# Altium integrated library Integrated_Library - 02.02.25 - 22.49.IntLib: 792 symbols (part 2 of 11) (continued)
## CMP-002-00038-2
designator J?, comment 10103594-0001LF
Micro USB 2.0 B Receptacle, 5 Position, Height 3.24 mm, -55 to 85 degC, RoHS, Tape and Reel; Manufacturer: FCI Electronics; Gender: Female; Current Rating: 1.8A; Voltage Rating: 100V; Min Operating Temperature: -55°C; Package Reference: FCI-10103594-0001LF; Max Operating Temperature: 85°C; Lead Pitch: 0.65mm; Case/Package: FCI-10103594-0001LF; Package Quantity: 1500; Connector Type: USB; Mounting Technology: SM; Datasheet Version: Rev. A, 06/2010; Contact Material: Copper; Package Description: 5-Pin Surface Mount Device, Body 8.04 x 5.62 mm; Contact Plating: Gold; Packaging: TapeandReel; Datasheet URL: http://portal.fciconnect.com/Comergent//fci/drawing/10103594.pdf; Pins: 5; RoHS Compliant: True; Manufacturer URL: http://portal.fciconnect.com/
footprint FCI-10103594-0001LF_V (SMD, 5-Leads, Body 8.04x5.62mm, Pitch 0.65 mm)
pins: 1 VBUS, 2 D-, 3 D+, 4 ID, 5 GND, 6 SHLD1, 7 SHLD2, 8 SHLD3, 9 SHLD4, 10 SHLD5, 11 SHLD6

## CMP-002-00039-2
designator J?, comment 1734366-1
Recept Assy Type A USB, 4 Position, Height 15 mm, -55 to 85 degC, RoHS, Tray; Manufacturer: TE Connectivity; Voltage Rating: 30V; Gender: Female; Current Rating: 1A; Manufacturer URL: http://www.te.com/; Packaging: Tray; Package Quantity: 24000; Pins: 4; Package Description: 6-Pin Through Hole Device, Length 15 mm, Height 15 mm, Tail Length 2.8 mm; Colour: Black; Max Operating Temperature: 50°C; Datasheet Version: Rev. C3, 03/2016; Contact Plating: Gold; Case/Package: 1734366-1; RoHS Compliant: True; Min Operating Temperature: 0°C; Voltage Rating (AC): 30V; Connector Type: USB; Package Reference: 1734366-1; Contact Material: Copper; Max Voltage Rating (AC): 30V; Datasheet URL: http://www.te.com/commerce/DocumentDelivery/DDEController?Action=showdoc&DocId=Customer+Drawing%7F1734366%7FC3%7Fpdf%7FEnglish%7FENG_CD_1734366_C3.pdf%7F1734366-1; Mounting Technology: TH
footprint TE-1734366-1_V (Connector, 6-Leads, Body 7.62x15mm)
pins: 1 VBUS, 2 D-, 3 D+, 4 GND, 5 SHLD1, 6 SHLD2

## CMP-002-00040-2
designator J?, comment 480-37-1000
Universal Serial Bus (USB) Shielded I/O Plug, Type A, Right Angle Connector, 4 Position, Height 4.6 mm, -20 to 85 degC, RoHS, Tray; Manufacturer: Molex; Gender: Male; Voltage Rating (AC): 150V; Max Current Rating: 1.5A; Package Description: 4-Pin Surface Mount Device, Body 12 x 18.8 mm; Max Operating Temperature: 85°C; Mounting Technology: SM; Contact Material: Brass; Case/Package: 480-37-1000; Connector Type: USB; Contact Plating: Gold; RoHS Compliant: True; Colour: Black; Datasheet URL: http://www.molex.com/pdm_docs/sd/480371000_sd.pdf; Manufacturer URL: http://www.molex.com/; Max Voltage Rating (AC): 150V; Datasheet Version: Rev. D, 06/2004; Current Rating: 1.5A; Min Operating Temperature: -20°C; Pins: 4; Package Reference: 480-37-1000; Packaging: Tray
footprint MOLX-480-37-1000_V (CONN, 4-Leads, Body 12x18.8mm)
pins: 1 VBUS, 2 D-, 3 D+, 4 GND, 5 SHLD1, 6 SHLD2

## CMP-002-00041-2
designator J?, comment 61729-1011BLF
USB Receptacle B Type, Right Angle, 4 Position, Height 11.5 mm,-40 to 85 degC, RoHS, Tube; Manufacturer: FCI Electronics; Current Rating: 1.5A; Gender: Female; Contact Material: Copper; Contact Plating: Nickel; Colour: Black; Max Operating Temperature: 40°C; Datasheet URL: http://portal.fciconnect.com/Comergent/fci/drawing/61729.pdf; Pins: 4; Lead Pitch: 2.5mm; Mounting Technology: TH; Packaging: Rail/Tube; Package Description: 4-Pin Through Hole Device, Body 16 x 12.2 mm; RoHS Compliant: True; Case/Package: 61729-1011BLF; Package Quantity: 44; Manufacturer URL: http://portal.fciconnect.com/; Package Reference: 61729-1011BLF; Datasheet Version: Rev. W, 05/2014; Connector Type: USB; Min Operating Temperature: 0°C
footprint FCI-61729-1011BLF_V (THD, 4-Leads, Body 16x12.2mm)
pins: 1 VBUS, 2 D-, 3 D+, 4 GND, 5 SHLD1, 6 SHLD2

## CMP-002-00042-2
designator J?, comment M701-330442
Single USB 2.0, Receptacle Connecter, B Type, Through Hole, 4 Position, Height 16.25 mm, -55 to 85 degC, RoHS, Tray; Manufacturer: Harwin; Current Rating: 1.5A; Gender: Female; Datasheet Version: Oct-15; Package Reference: M701-330442; Packaging: Tray; Pins: 4; Colour: White; Contact Plating: Gold; Contact Material: Bronze; RoHS Compliant: True; Case/Package: M701-330442; Mounting Technology: TH; Lead Pitch: 2.5mm; Datasheet URL: https://cdn.harwin.com/pdfs/M701-330442.pdf; Connector Type: USB; Min Operating Temperature: -55°C; Package Description: USB Connecter, 4 Position Through Hole, Length 12.04 mm, Height 16.25 mm, Tail Length 3.1 mm; Package Quantity: 100; Max Operating Temperature: 85°C
footprint HRWN-M701-330442_V (USB, 4-Leads, Body 12.04x10.6mm, Pitch 2.5mm)
pins: 1 VBUS, 2 D-, 3 D+, 4 GND, 5 SHLD1, 6 SHLD2

## CMP-002-00043-2
designator J?, comment ZX62D-B-5P8
Right Angle Receptacle Connector, Micro USB, 5 Position, Height 2.65 mm, -30 to 85 degC, RoHS, Tape and Reel; Manufacturer: Hirose Electric; Gender: Male; Rows: 1; Current Rating: 1A; Max Operating Temperature: 85°C; Package Quantity: 2000; Connector Type: USB; Datasheet Version: Aug-16; Contact Material: Copper; Packaging: TapeandReel; Package URL: https://www.hirose.com/product/en/download_file/key_name/ZX62D-B-5P8/category/Drawing%20(2D)/doc_file_id/36535/?file_category_id=6&item_id=02420034000&is_series=; Min Operating Temperature: -30°C; Case/Package: ZX62D-B-5P8; Package Reference: ZX62D-B-5P8; Pins: 5; Mounting Technology: SM; Package Description: USB Connector, 5 Position Surface Mount, Length 8 mm, Height 2.65 mm; Housing Material: Plastic; Datasheet URL: https://www.hirose.com/product/en/download_file/key_name/ZX62D-B-5P8/category/Catalog/doc_file_id/31704/?file_category_id=5&item_id=02420034000&is_series=; Contact Plating: Gold; Lead Pitch: 0.65mm; RoHS Compliant: True; Manufacturer URL: https://www.hirose.com
footprint HIRO-ZX62D-B-5P8_V (Micro-USB Connector, 9-Leads, Body 7.5x5.6mm, Pitch 0.65mm)
pins: 1 VBUS, 2 D-, 3 D+, 4 ID, 5 GND, 6 SHLD1, 7 SHLD2, 8 SHLD3, 9 SHLD4

## CMP-002-00044-2
designator U?, comment CAF98-06206-S100
SIM Card Socket, 50 V, 0.5 A, 9-Pin SMD, Halogen Free; Manufacturer: LCN; Current: 0.5A; Gender: Female; Voltage: 50V; Pins: 9; Datasheet URL: http://www.linkconn.com/Content/Linkconn/Uploads/file/20140308/CAF98-06206-S100-cus-G.pdf; Datasheet Version: Rev. G, 06/2013; Mounting Technology: SM; Case/Package: CAF98-06206-S100; Manufacturer URL: http://www.linkconn.com/index; Halogen Compliant: True; Connector Type: Socket; Package Reference: CAF98-06206-S100; Package Description: 9-Pin Surface Mount Device, Body 19.1 x 26.6 mm
footprint LCN-CAF98-06206-S100_V (SMD, 9-Leads, Body 26.6x19.1mm)
pins: 1 I/O (io), 2 CLK (in), 3 VPP (power), 4 RST (in), 5 GND (power), 6 VCC (power), 7 CD (out), 8 GND (power), 9 GND (power)

## CMP-002-00045-2
designator J?, comment 734120110
Microcoaxial RF, 60 V, 50 Ohm, -40 to 90 degC, 4-Pin SMD, RoHS, Tape and Reel; Manufacturer: Molex; Voltage: 60V; Connector Type: RF&Coax; Gender: Male; Case/Package: 0734120110; Max Operating Temperature: 90°C; Package Reference: 734120110; Pins: 4; Datasheet URL: http://www.molex.com/pdm_docs/sd/734120110_sd.pdf; RoHS Compliant: True; Datasheet Version: 42186; Mounting Technology: SM; Packaging: TapeandReel; Min Operating Temperature: -40°C; Manufacturer URL: http://www.molex.com/; Package Description: 4-Pin Surface Mount Device, Body 2.6 x 2.6 mm
footprint MOLX-73412-0110_V (MCRF, 4-Leads, Body 2.6x2.6mm)
pins: 1, 2, 3, 4

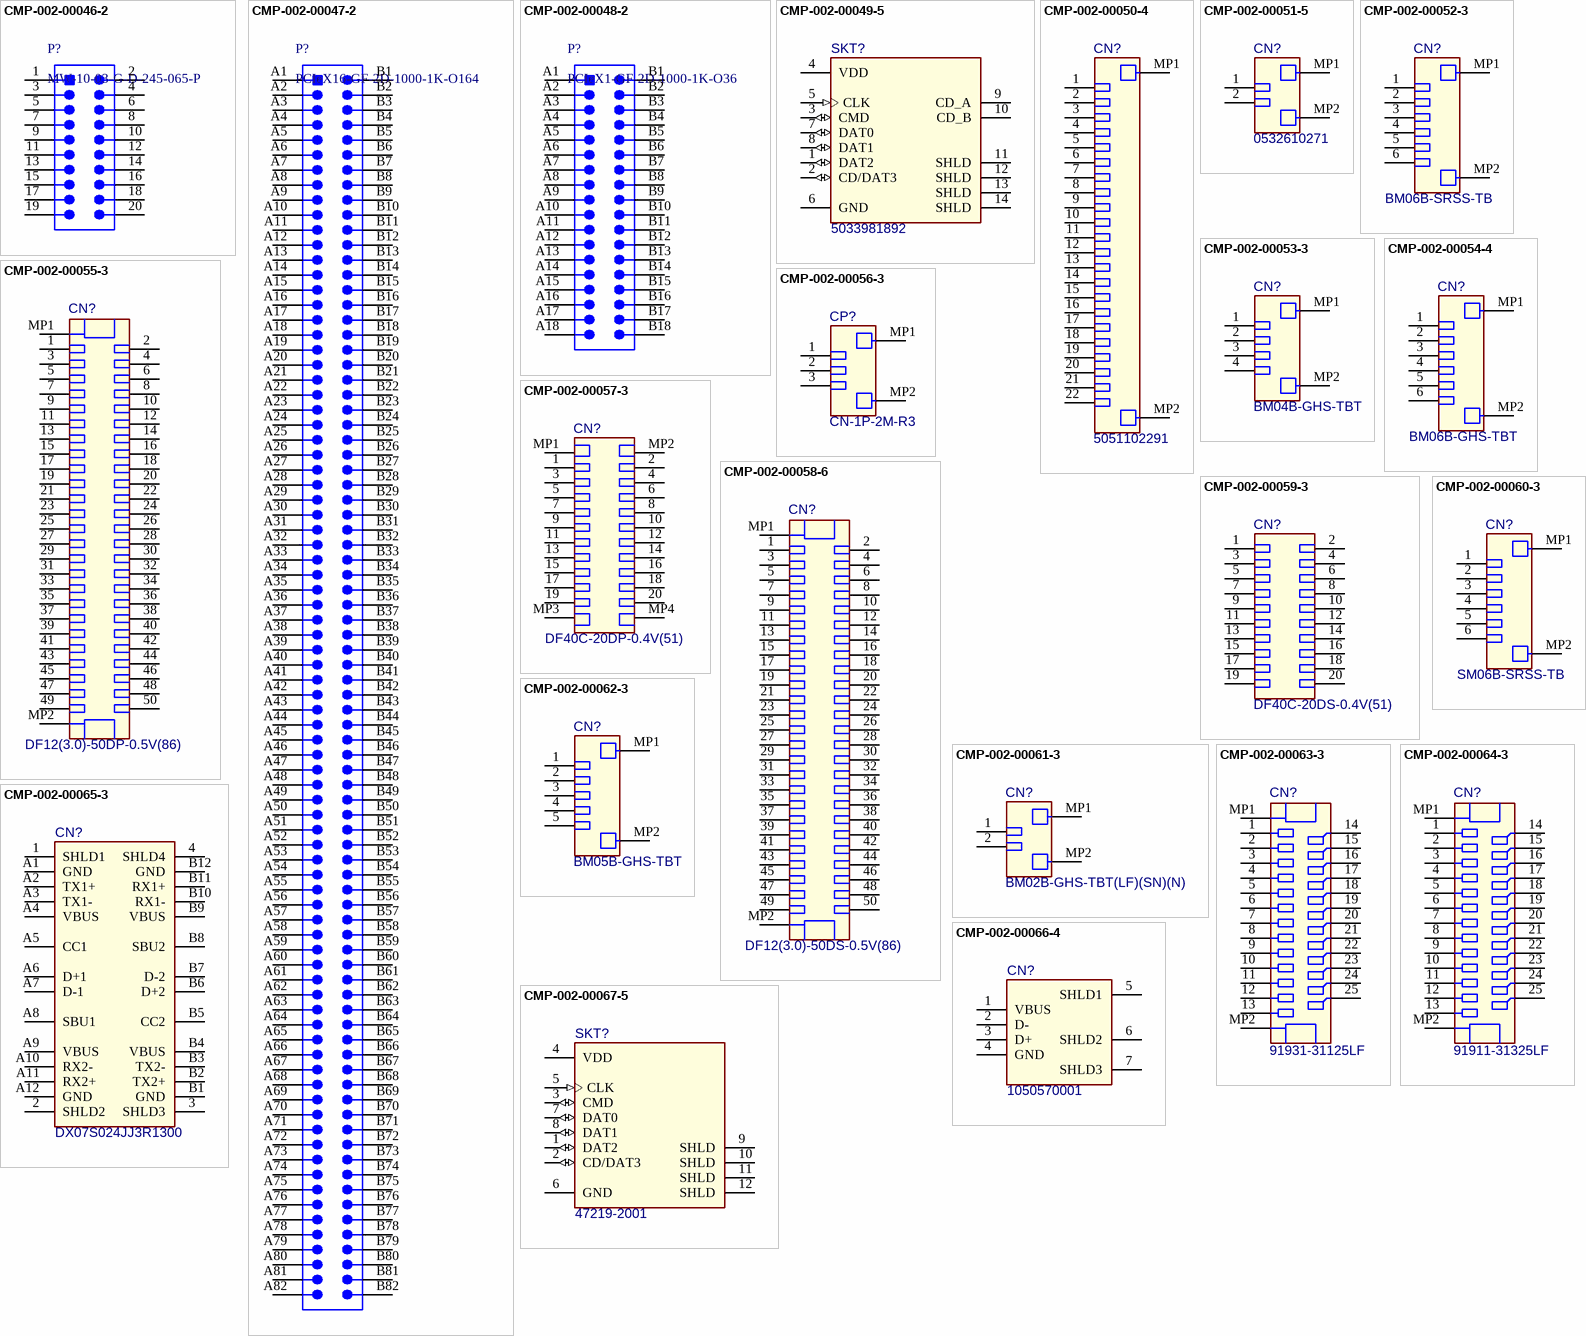
[diagram p4: symbols CMP-002-00046-2 to CMP-002-00067-5]

## CMP-002-00046-2
designator P?, comment MW-10-03-G-D-245-065-P
Flexible Micro Board Stacker, Pitch 1 mm, 2 x 10 Position, Height 9.4 mm, -55 to 125 degC, RoHS, Tape and Reel; Manufacturer: Samtec; Connector Type: Header; Gender: Male; Min Operating Temperature: -55°C; Pins: 20; Datasheet URL: http://suddendocs.samtec.com/prints/mw-xx-03-x-d-xxx-xxx-xx-mkt.pdf; Package Reference: MW-10-03-G-D-245-065-P; Case/Package: MW-10-03-G-D-245-065-P; Package Description: Flexible Micro Board Stacker, Pitch 1 mm, 2 x 10 Position, Height 9.4 mm; Packaging: TapeandReel; Max Operating Temperature: 125°C; RoHS Compliant: True; Datasheet Version: 34759; Manufacturer URL: https://www.samtec.com/; Mounting Technology: SM
footprint SMTC-MW-10-03-G-D-245-065-P_V (CONN, 20-Leads, Body 3.18x10mm, Pitch 1mm)
pins: 1, 2, 3, 4, 5, 6, 7, 8, 9, 10, 11, 12, 13, 14, 15, 16, 17, 18, 19, 20

## CMP-002-00047-2
designator P?, comment PCIeX16-GF-2D-1000-1K-O164
Golden Finger, PCIeX16, Dual, Opposite, Pitch 1mm, 164-Position; Connector Type: EdgeConnector; Gender: Male; Package Reference: PCIeX16-GF-2D-1000-1K-O164; Package Description: Edge Connector, Golden Finger, Pitch 1 mm, 2 x 82 Position; Mounting Technology: SM; Case/Package: PCIeX16-GF-2D-1000-1K-O164; Pins: 164
footprint PCIeX16-GF-2D-1000-1K-O164 (Golden finger, PCIeX16, Dual, Opposite, Pitch 1mm, 164-Position)
pins: A1, A2, A3, A4, A5, A6, A7, A8, A9, A10, A11, A12, A13, A14, A15, A16, A17, A18, A19, A20, A21, A22, A23, A24, A25, A26, A27, A28, A29, A30, A31, A32, A33, A34, A35, A36, A37, A38, A39, A40, A41, A42, A43, A44, A45, A46, A47, A48, A49, A50, A51, A52, A53, A54, A55, A56, A57, A58, A59, A60, A61, A62, A63, A64, A65, A66, A67, A68, A69, A70, A71, A72, A73, A74, A75, A76, A77, A78, A79, A80, A81, A82, B1, B2, B3, B4, B5, B6, B7, B8, B9, B10, B11, B12, B13, B14, B15, B16, B17, B18, B19, B20, B21, B22, B23, B24, B25, B26, B27, B28, B29, B30, B31, B32, B33, B34, B35, B36, B37, B38, B39, B40, B41, B42, B43, B44, B45, B46, B47, B48, B49, B50, B51, B52, B53, B54, B55, B56, B57, B58, B59, B60, B61, B62, B63, B64, B65, B66, B67, B68, B69, B70, B71, B72, B73, B74, B75, B76, B77, B78, B79, B80, B81, B82

## CMP-002-00048-2
designator P?, comment PCIeX1-GF-2D-1000-1K-O36
Golden Finger, PCIeX1, Dual, Opposite, Pitch 1mm, 36-Position; Gender: Male; Connector Type: EdgeConnector; Package Description: Edge Connector, Golden Finger, Pitch 1 mm, 2 x 18 Position; Case/Package: PCIeX1-GF-2D-1000-1K-O36; Pins: 36; Mounting Technology: SM; Package Reference: PCIeX1-GF-2D-1000-1K-O36
footprint PCIeX1-GF-2D-1000-1K-O36 (Golden finger, PCIeX1, Dual, Opposite, Pitch 1mm, 36-Position)
pins: A1, A2, A3, A4, A5, A6, A7, A8, A9, A10, A11, A12, A13, A14, A15, A16, A17, A18, B1, B2, B3, B4, B5, B6, B7, B8, B9, B10, B11, B12, B13, B14, B15, B16, B17, B18

## CMP-002-00049-5
designator SKT?, comment 5033981892
Micro SD Card Connector, Pitch 1.1 mm, 8 Position, Height 1.4 mm, -25 to 85 degC, RoHS, Tape and Reel; Pins: 14
footprint MOLX-5033981892_V (CONN, 8-Leads, Body 14.05x13.2mm, Pitch 1.1mm)
footprint MOLX-5033981892_V (CONN, 8-Leads, Body 14.05x13.2mm, Pitch 1.1mm)
pins: 1 DAT2 (io), 2 CD/DAT3 (io), 3 CMD (io), 4 VDD (power), 5 CLK (in), 6 GND, 7 DAT0 (io), 8 DAT1 (io), 9 CD_A, 10 CD_B, 11 SHLD, 12 SHLD, 13 SHLD, 14 SHLD

## CMP-002-00050-4
designator CN?, comment 5051102291
Right Angle FFC/FPC Connector, 50 V, 0.5 A, -40 to 105 degC, RoHS, Tape and Reel; Pins: 24
footprint MOLX-5051102291_V (SMD, 22-Leads, Body 5.3x16.5mm, Pitch 0.5mm)
footprint MOLX-5051102291_V (SMD, 22-Leads, Body 5.3x16.5mm, Pitch 0.5mm)
pins: 1, 2, 3, 4, 5, 6, 7, 8, 9, 10, 11, 12, 13, 14, 15, 16, 17, 18, 19, 20, 21, 22, MP1, MP2

## CMP-002-00051-5
designator CN?, comment 0532610271
Header, Pitch 1.25 mm, 1 x 2 Position, Height 3.6 mm, -40 to 85 degC; Gender: HDR; Connector Type: WiretoBoard; Pins: 4
footprint JST-BM02B-GHS-TBT_V (Connector, 2-Leads, Body 5.75x4.25mm, Pitch 1.25mm)
footprint MOLX-532610271_V (SMD, 2-Leads, Body 7.65x4.2mm, Pitch 1.25mm)
pins: 1, 2, MP1, MP2

## CMP-002-00052-3
designator CN?, comment BM06B-SRSS-TB
Header, Pitch 1 mm, 1 x 6 Position, Height 4.25 mm, -25 to 85 degC; Connector Type: Header,Shrouded; Pins: 8
footprint JST-SM06B-SRSS-TB_V (SMD, 6-Leads, Body 8x4.25mm, Pitch 1mm)
footprint JST-BM06B-SRSS-TB_V (SMD, 6-Leads, Body 2.9x8mm, Pitch 1mm)
pins: 1, 2, 3, 4, 5, 6, MP1, MP2

## CMP-002-00053-3
designator CN?, comment BM04B-GHS-TBT
Header, Pitch 1.25 mm, 1 x 4 Position, Height 4.05 mm, -25 to 85 degC; Pins: 6
footprint JST-BM04B-GHS-TBT_V (Connector, 4-Leads, Body 8.25x4.25mm, Pitch 1.25mm)
footprint JST-BM04B-GHS-TBT_V (Connector, 4-Leads, Body 8.25x4.25mm, Pitch 1.25mm)
pins: 1, 2, 3, 4, MP1, MP2

## CMP-002-00054-4
designator CN?, comment BM06B-GHS-TBT
Header, Pitch 1.25 mm, 1 x 6 Position, Height 4.05 mm, -25 to 85 degC; Pins: 8
footprint JST-SM06B-SRSS-TB_V (SMD, 6-Leads, Body 8x4.25mm, Pitch 1mm)
footprint JST-BM06B-GHS-TBT_V (Connector, 6-Leads, Body 10.75x4.25mm, Pitch 1.25mm)
pins: 1, 2, 3, 4, 5, 6, MP1, MP2

## CMP-002-00055-3
designator CN?, comment DF12(3.0)-50DP-0.5V(86)
Plug Connector, 50 V, 0.3 A, -45 to 125 degC, RoHS, Tape and Reel; Pins: 52
footprint HIRO-DF12(3.0)-50DS-0.5V_V (SMD, 50-Leads, Body 14.6x3.6mm, Pitch 0.5mm)
footprint HIRO-DF12(3.0)-50DP-0.5V_V (SMD, 50-Leads, Body 14.7x3.8mm, Pitch 0.5mm)
pins: 1, 2, 3, 4, 5, 6, 7, 8, 9, 10, 11, 12, 13, 14, 15, 16, 17, 18, 19, 20, 21, 22, 23, 24, 25, 26, 27, 28, 29, 30, 31, 32, 33, 34, 35, 36, 37, 38, 39, 40, 41, 42, 43, 44, 45, 46, 47, 48, 49, 50, MP1, MP2

## CMP-002-00056-3
designator CP?, comment CN-1P-2M-R3
AMASS 500V 15A   0.8 mOhm; Pins: 5
footprint MR30PW-FB-Footprint-1
footprint MR30PW-FB-Footprint-1
pins: 1, 2, 3, MP1, MP2

## CMP-002-00057-3
designator CN?, comment DF40C-20DP-0.4V(51)
Plug Connector, 30 V, 0.3 A, -35 to 85 degC, RoHS, Tape and Reel; Pins: 24
footprint HIRO-DF40C-20DP-0.4V(51)_V (CONN, 20-Lead, Body 5.52x1.85mm, Pitch 0.4mm)
footprint HIRO-DF40C-20DP-0.4V(51)_V (CONN, 20-Lead, Body 5.52x1.85mm, Pitch 0.4mm)
pins: 1, 2, 3, 4, 5, 6, 7, 8, 9, 10, 11, 12, 13, 14, 15, 16, 17, 18, 19, 20, MP1 MP, MP2 MP, MP3 MP, MP4 MP

## CMP-002-00058-6
designator CN?, comment DF12(3.0)-50DS-0.5V(86)
Receptacle Connector, 50 V, 0.3 A, -45 to 125 degC, RoHS, Tape and Reel; Pins: 52
footprint HIRO-DF12(3.0)-50DS-0.5V_V (SMD, 50-Leads, Body 14.6x3.6mm, Pitch 0.5mm)
footprint HIRO-DF12(3.0)-50DS-0.5V_V (SMD, 50-Leads, Body 14.6x3.6mm, Pitch 0.5mm)
pins: 1, 2, 3, 4, 5, 6, 7, 8, 9, 10, 11, 12, 13, 14, 15, 16, 17, 18, 19, 20, 21, 22, 23, 24, 25, 26, 27, 28, 29, 30, 31, 32, 33, 34, 35, 36, 37, 38, 39, 40, 41, 42, 43, 44, 45, 46, 47, 48, 49, 50, MP1, MP2

## CMP-002-00059-3
designator CN?, comment DF40C-20DS-0.4V(51)
Receptacle Connector, 30 V, 0.3 A, -35 to 85 degC, RoHS, Tape and Reel; Connector Type: Receptacle,CenterStripContacts; Pins: 20
footprint HIRO-DF40C-20DS-0.4V(51)_V (CONN, 20-Lead, Body 6.6x2.88mm, Pitch 0.4mm)
footprint HIRO-DF40C-20DS-0.4V(51)_V (CONN, 20-Lead, Body 6.6x2.88mm, Pitch 0.4mm)
pins: 1, 2, 3, 4, 5, 6, 7, 8, 9, 10, 11, 12, 13, 14, 15, 16, 17, 18, 19, 20

## CMP-002-00060-3
designator CN?, comment SM06B-SRSS-TB
Male Header, Pitch 1 mm, 1 x 6 Position, Height 2.95 mm, -25 to 85 degC, RoHS, Tape and Reel; Pins: 8; Case/Package: Male Header, Pitch 1 mm, 1 X 6 Position, Height 2.9 mm; Mounting Technology: SurfaceMount
footprint JST-SM06B-SRSS-TB_V (SMD, 6-Leads, Body 8x4.25mm, Pitch 1mm)
footprint JST-SM06B-SRSS-TB_V (SMD, 6-Leads, Body 8x4.25mm, Pitch 1mm)
pins: 1, 2, 3, 4, 5, 6, MP1, MP2

## CMP-002-00061-3
designator CN?, comment BM02B-GHS-TBT(LF)(SN)(N)
Disconnectable Crimp Style Connector, Pitch 1.25 mm, 1 x 2 Position, Height 4.05 mm, -25 to 85 degC, RoHS, Tape and Reel; Connector Type: Header,Shrouded; Mounting Technology: SurfaceMount; Case/Package: Disconnectable Crimp Style Connector, Pitch 1.25 mm, 1 x 2 Position, Height 4.05 mm; Pins: 4
footprint JST-BM02B-GHS-TBT_V (Connector, 2-Leads, Body 5.75x4.25mm, Pitch 1.25mm)
footprint JST-BM02B-GHS-TBT_V (Connector, 2-Leads, Body 5.75x4.25mm, Pitch 1.25mm)
pins: 1, 2, MP1, MP2

## CMP-002-00062-3
designator CN?, comment BM05B-GHS-TBT
GH Disconnectable Crimp Style Connector, Pitch 1.25 mm, 1 x 5 Position, Height 4.05 mm, -25 to 85 degC, RoHS, Tape and Reel; Mounting Technology: SurfaceMount; Pins: 7; Case/Package: GH Disconnectable Crimp Style Connector, Pitch 1.25 mm, 1 x 5 Position, Height 4.05 mm
footprint JST-BM05B-GHS-TBT_V (Connector, 5-Leads, Body 9.5x4.25mm, Pitch 1.25mm)
footprint JST-BM05B-GHS-TBT_V (Connector, 5-Leads, Body 9.5x4.25mm, Pitch 1.25mm)
pins: 1, 2, 3, 4, 5, MP1, MP2

## CMP-002-00063-3
designator CN?, comment 91931-31125LF
Receptacle, Pitch 1 mm, 25 Position, Height 4.15 mm, -55 to 130 degC; Pins: 27
footprint AMPH-91911-31325_V (SMD, 25-Leads, Body 5.59x17.3mm, Pitch 1mm)
footprint AMPH-91931-31125_V (SMD, 25-Leads, Body 5.59x17.3mm, Pitch 1mm)
pins: 1, 2, 3, 4, 5, 6, 7, 8, 9, 10, 11, 12, 13, 14, 15, 16, 17, 18, 19, 20, 21, 22, 23, 24, 25, MP1, MP2

## CMP-002-00064-3
designator CN?, comment 91911-31325LF
Header, Pitch 1 mm, 25 Position, Height 5 mm, -55 to 130 degC; Pins: 27
footprint AMPH-91911-31325_V (SMD, 25-Leads, Body 5.59x17.3mm, Pitch 1mm)
footprint AMPH-91911-31325_V (SMD, 25-Leads, Body 5.59x17.3mm, Pitch 1mm)
pins: 1, 2, 3, 4, 5, 6, 7, 8, 9, 10, 11, 12, 13, 14, 15, 16, 17, 18, 19, 20, 21, 22, 23, 24, 25, MP1, MP2

## CMP-002-00065-3
designator CN?, comment DX07S024JJ3R1300
USB-C Connector, 20 V, 1.25 A, -30 to 80 degC, RoHS, Tape and Reel; Gender: Receptacle; Pins: 28; Connector Type: USB-C
footprint JAE-DX07S024JJ3_V (THD, 24-Leads, Body 8.17x8.94mm, Pitch 0.5mm)
footprint JAE-DX07S024JJ3_V (THD, 24-Leads, Body 8.17x8.94mm, Pitch 0.5mm)
pins: 1 SHLD1, 2 SHLD2, 3 SHLD3, 4 SHLD4, A1 GND, A2 TX1+, A3 TX1-, A4 VBUS, A5 CC1, A6 D+1, A7 D-1, A8 SBU1, A9 VBUS, A10 RX2-, A11 RX2+, A12 GND, B1 GND, B2 TX2+, B3 TX2-, B4 VBUS, B5 CC2, B6 D+2, B7 D-2, B8 SBU2, B9 VBUS, B10 RX1-, B11 RX1+, B12 GND

## CMP-002-00066-4
designator CN?, comment 1050570001
USB-A Connector, 30 V, 1.5 A, -40 to 85 degC, RoHS, Tape and Reel; Gender: RCP; Pins: 7; RoHS Compliant: Yes
footprint MOLX-1050570001_V (THD, 4-Leads, Body 14.63x7.25mm)
footprint MOLX-1050570001_V (THD, 4-Leads, Body 14.63x7.25mm)
pins: 1 VBUS, 2 D-, 3 D+, 4 GND, 5 SHLD1, 6 SHLD2, 7 SHLD3

## CMP-002-00067-5
designator SKT?, comment 47219-2001
MicroSD Card Connector, Hinge Type, -40 to 85 degC, 8-Pin SMD, RoHS, Tape and Reel; Pins: 12; RoHS Compliant: Details
footprint MOLX-47219-2001-8_V (CONN, 8-Leads, Body 14.5x13.6mm, Pitch 1.1mm)
footprint MOLX-47219-2001-8_V (CONN, 8-Leads, Body 14.5x13.6mm, Pitch 1.1mm)
pins: 1 DAT2 (io), 2 CD/DAT3 (io), 3 CMD (io), 4 VDD (power), 5 CLK (in), 6 GND, 7 DAT0 (io), 8 DAT1 (io), 9 SHLD, 10 SHLD, 11 SHLD, 12 SHLD

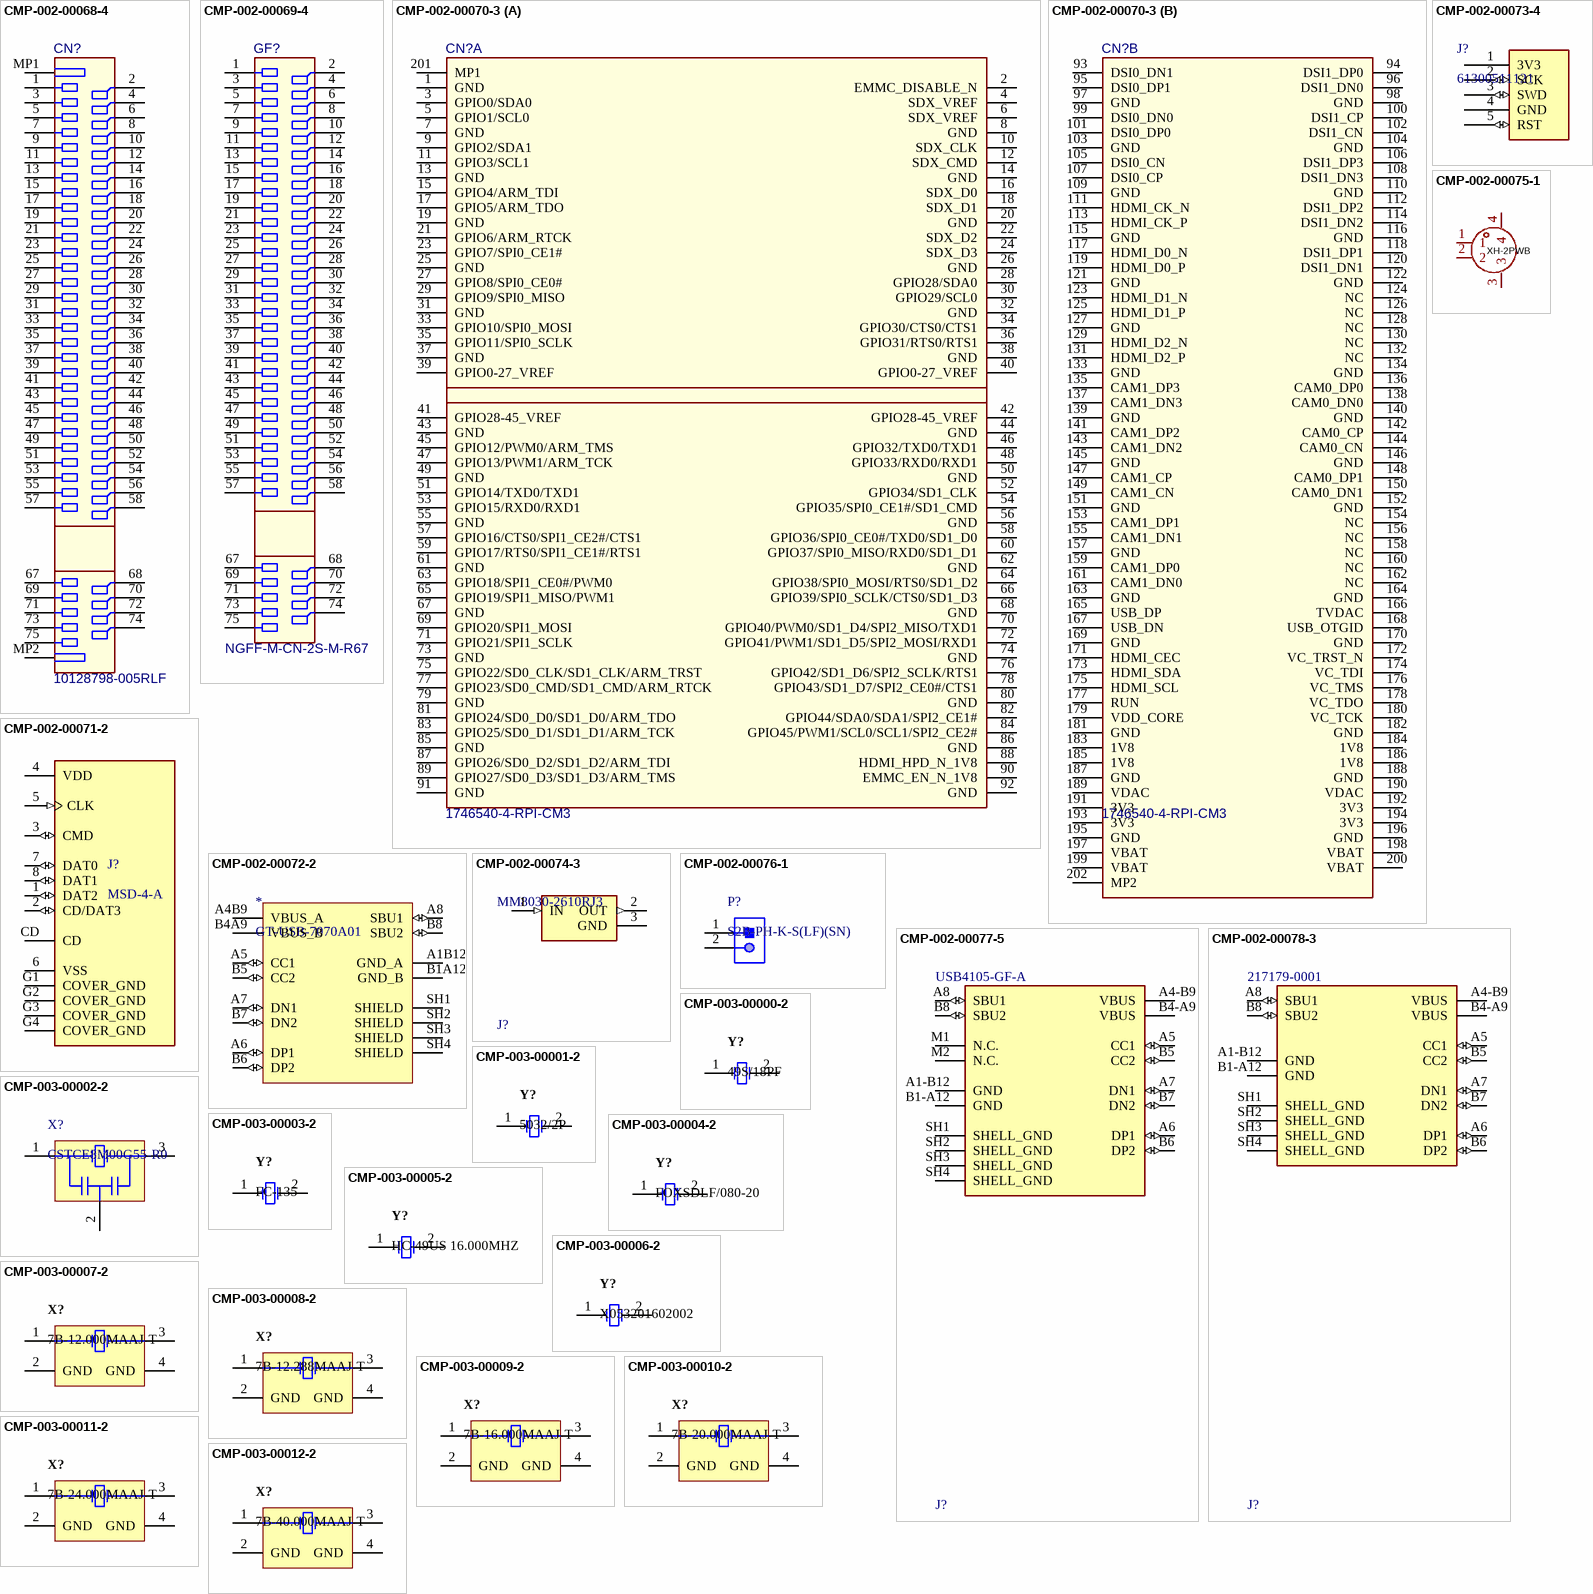
[diagram p5: symbols CMP-002-00068-4 to CMP-003-00012-2]

## CMP-002-00068-4
designator CN?, comment 10128798-005RLF
Card Edge Connector, Pitch 0.5 mm, 67 Position, Height 5.8 mm; Pins: 69
footprint AMPH-10128798-005RLF_V (SMD, 67-Leads, Body 21.9x7.2mm, Pitch 0.5mm)
footprint AMPH-10128798-005RLF_V (SMD, 67-Leads, Body 21.9x7.2mm, Pitch 0.5mm)
pins: 1, 2, 3, 4, 5, 6, 7, 8, 9, 10, 11, 12, 13, 14, 15, 16, 17, 18, 19, 20, 21, 22, 23, 24, 25, 26, 27, 28, 29, 30, 31, 32, 33, 34, 35, 36, 37, 38, 39, 40, 41, 42, 43, 44, 45, 46, 47, 48, 49, 50, 51, 52, 53, 54, 55, 56, 57, 58, 67, 68, 69, 70, 71, 72, 73, 74, 75, MP1, MP2

## CMP-002-00069-4
designator GF?, comment NGFF-M-CN-2S-M-R67  (no BOM)
Golden finger, NGFF key M, Dual, Staggered, Pitch 0.5mm, 67-Position; Pins: 67
footprint NGFF-M-GF-2D-500-1K-S67 (Golden finger, NGFF key M, Dual, Staggered, Pitch 0.5mm, 47-Position)
footprint NGFF-M-GF-2D-500-1K-S67 (Golden finger, NGFF key M, Dual, Staggered, Pitch 0.5mm, 47-Position)
pins: 1, 2, 3, 4, 5, 6, 7, 8, 9, 10, 11, 12, 13, 14, 15, 16, 17, 18, 19, 20, 21, 22, 23, 24, 25, 26, 27, 28, 29, 30, 31, 32, 33, 34, 35, 36, 37, 38, 39, 40, 41, 42, 43, 44, 45, 46, 47, 48, 49, 50, 51, 52, 53, 54, 55, 56, 57, 58, 67, 68, 69, 70, 71, 72, 73, 74, 75